# Altium footprint library PASSIVE_THD.PCBLIB: 84 footprints (part 6 of 6)
Each footprint in its own frame and in the unit in brackets; x right, y up, seen from the top. Pads: shape width x height; smd on the part's side, far side on the other; paste and mask are expansions set on the pad; w line width, h text height; cw(c..) or ccw(c..) is an arc to the next point about the centre after c.
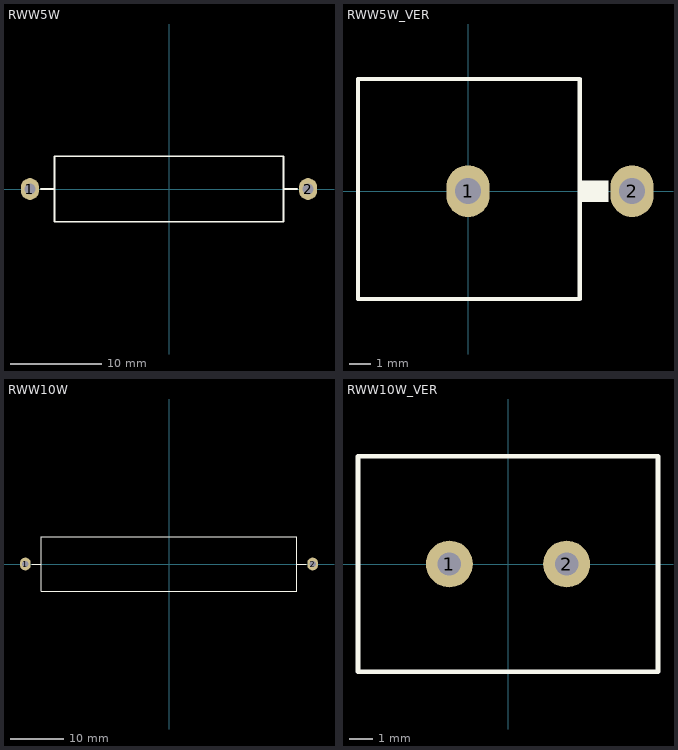
[diagram p5: the footprints below, top view; thin cyan lines are the x and y axes]

## RWW5W [mm] "RESISTOR 5 WATT, Ceramic Wirewound"
height 4.064
pads (2):
  oval 2x2.4 hole 1.2: 1(-15.3,0) 2(15.3,0)
TopOverlay:
  lines w0.2: -14.1,0 -12.6,0 ; 12.6,0 14.1,0 ; -12.6,-3.6 -12.6,3.6 12.6,3.6 12.6,-3.6 -12.6,-3.6
3D body "RES 5W.STEP": height 8.35, standoff -2.85, extent -15.645,-3.5 15.635,3.5

## RWW5W_VER [mm] "RESISTOR 5 WATT, Ceramic Wirewound"
pads (2):
  oval 2x2.4 hole 1.2: 1(0,0) 2(7.6,0)
TopOverlay:
  rectangle: 5.2,-0.5 6.5,0.5
  lines w0.2: -5.1,-5 5.17,-5 5.17,5.2 -5.1,5.2 -5.1,-5
3D body "5W Res.STEP": height 23.05, standoff -2.4, extent -4.965,-4.928 8.115,5.072

## RWW10W [mm] "RESISTOR 10 WATT, Ceramic Wirewound"
height 9
pads (2):
  oval 2x2.4 hole 1.2: 1(-27,0) 2(27,0)
TopOverlay:
  lines w0.2: -25.8,0 -24,0 ; 24,0 25.8,0 ; -24,-5.1 -24,5.1 24,5.1 24,-5.1 -24,-5.1
3D body: height 4.9, standoff 4.1, extent 23.9,-0.4 27.4,0.4
3D body: height 4.8, standoff -2, extent 26.601,-0.4 27.399,0.396
3D body: height 4.8, standoff -2, extent -27.399,-0.397 -26.601,0.4
3D body: height 4.9, standoff 4.1, extent -27.4,-0.4 -23.9,0.4
3D body: height 9, standoff 0, extent -23.9,-5 23.9,5

## RWW10W_VER [mm] "RESISTOR 10 WATT, Ceramic Wirewound"
pads (2):
  round 2 hole 1: 1(-2.5,0) 2(2.5,0)
TopOverlay:
  lines w0.2: -6.4,-4.6 -6.4,4.6 6.4,4.6 6.4,-4.6 -6.4,-4.6
3D body "User Library-Cement Power Resistor SQM-10 10W R10.step": height 51, standoff -5, extent -6.25,-4.5 6.25,4.5